# Altium footprint library SBCLib.PcbLib: 120 footprints (part 3 of 8)
Each footprint in its own frame and in the unit in brackets; x right, y up, seen from the top. Pads: shape width x height; smd on the part's side, far side on the other; paste and mask are expansions set on the pad; w line width, h text height; cw(c..) or ccw(c..) is an arc to the next point about the centre after c.
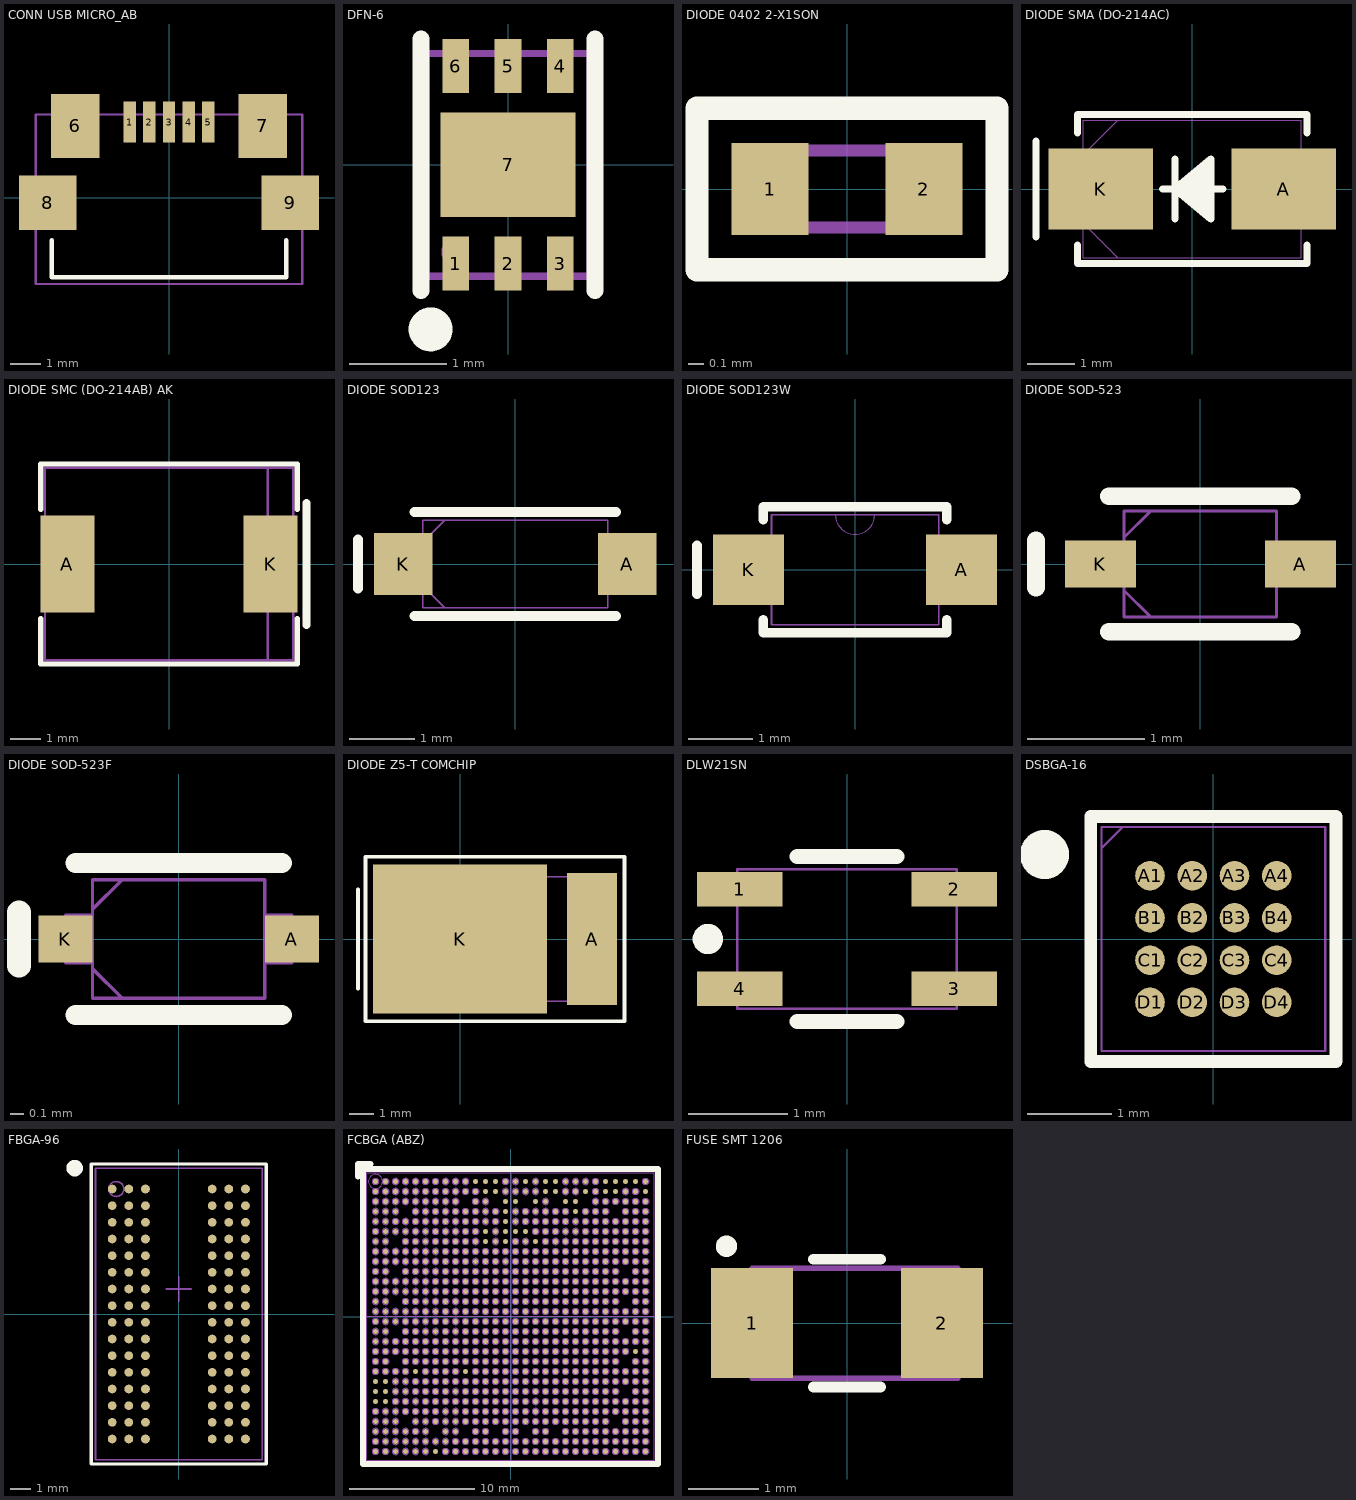
[diagram p2: the footprints below, top view; thin cyan lines are the x and y axes]

## CONN USB MICRO_AB [mil]
pads (9):
  rect 16x53 smd paste+0: 1(-51.18,98.5) 2(-25.59,98.5) 3(0,98.5) 4(25.59,98.5) 5(51.18,98.5)
  rect 63x83 smd: 6(-122,93.5) 7(122,93.5)
  rect 75x71 smd: 8(-157.5,-6.5) 9(157.5,-6.5)
Top Overlay:
  lines w6: -152.5,-55.1 -152.5,-103.5 152.5,-103.5 152.5,-55.1
Mechanical 3:
  lines w3: -173.23,-112.14 173.23,-112.14 173.23,108.34 -173.23,108.34 -173.23,-112.14
3D body "ZX62-AB-5PA.stp": height 108.27, standoff -7.87, extent -173.23,-112.14 173.23,108.34

## DFN-6 [mm] "SKY65723"
pads (7):
  rect 0.275x0.56 smd paste+0: 1(-0.54,-1.02) 2(0,-1.02) 3(0.54,-1.02) 4(0.54,1.02) 5(0,1.02) 6(-0.54,1.02)
  rect 1.4x1.08 smd paste+0: 7(0,0)
Top Overlay:
  circle w0.254: c-0.8,-1.7 r0.1
  lines w0.178: -0.9,-1.3 -0.9,1.3 ; 0.9,-1.3 0.9,1.3
Mechanical 3:
  circle w0.076: c-0.55,-0.9 r0.1
  lines w0.076: -0.85,-1.15 -0.85,1.15 0.85,1.15 0.85,-1.15 -0.85,-1.15
3D body: height 0.7, standoff 0, extent -0.85,-1.15 0.85,1.15

## DIODE 0402 2-X1SON [mm]
pads (2):
  rect 0.5x0.6 smd mask+0.05: 1(-0.5,0) 2(0.5,0)
Top Overlay:
  lines w0.152: -0.976,-0.526 -0.976,0.526 0.976,0.526 0.976,-0.526 -0.976,-0.526
Mechanical 3:
  lines w0.076: -0.55,-0.25 -0.55,0.25 0.55,0.25 0.55,-0.25 -0.55,-0.25
3D body "DPY0002A.stp": height 0.45, standoff 0, extent -0.5,-0.3 0.5,0.3

## DIODE SMA (DO-214AC) [mil] "GENERIC SMA DIODE"
height 90
pads (2):
  rect 87x67 smd paste+0: A(76,0) K(-76,0)
Top Overlay:
  lines w6: -130,-40 -130,40 ; -95.5,-46.6 -95.5,-62 95.5,-62 95.5,-46.6 ; -95.5,46.6 -95.5,62 95.5,62 95.5,46.6 ; -24.5,0 25.5,0 ; -14.5,-25 -14.5,25 ; 15.5,-20 -14.5,0 ; 15.5,-15 -14.5,0 ; 15.5,-10 -14.5,0 ; 15.5,-5 -14.5,0 ; 15.5,5 -14.5,0 ; 15.5,10 -14.5,0 ; 15.5,15 -14.5,0 ; 15.5,20 -14.5,0 ; -14.5,0 15.5,-25 15.5,25 -14.5,0
Mechanical 3:
  lines w1: -90.5,-28.5 -62,-57 ; -90.5,28.5 -62,57 ; -105.5,-32.5 -105.5,32.5 -90.5,32.5 -90.5,-32.5 -105.5,-32.5 ; -90.5,-57 90.5,-57 90.5,57 -90.5,57 -90.5,-57 ; 90.5,-32.5 90.5,32.5 105.5,32.5 105.5,-32.5 90.5,-32.5
3D body "SMA_STM.step": height 123.78, standoff 0.18, extent -105.5,-57 105.52,57.01

## DIODE SMC (DO-214AB) AK [mm]
pads (2):
  rect 1.778x3.175 smd: A(-3.325,0) K(3.325,0)
Top Overlay:
  lines w0.178: -4.2,-1.8 -4.2,-3.275 4.2,-3.275 4.2,-1.8 ; -4.2,1.8 -4.2,3.275 4.2,3.275 4.2,1.8
  lines w0.254: 4.5,-2 4.5,2
Mechanical 3:
  lines w0.076: 3.232,-3.15 3.232,3.15 ; -4.064,-3.15 -4.064,3.15 4.064,3.15 4.064,-3.15 -4.064,-3.15
3D body "DO-214AB(SMC).step": height 2.67, standoff 0.03, extent -4.064,-3.15 4.064,3.15

## DIODE SOD123 [mm]
pads (2):
  rect 0.9x0.95 smd: A(1.725,0) K(-1.725,0)
Top Overlay:
  lines w0.152: -2.425,-0.375 -2.425,0.375 ; -1.552,-0.802 1.552,-0.802 ; -1.552,0.802 1.552,0.802
Mechanical 3:
  lines w0.025: -1.425,-0.337 -1.087,-0.675 ; -1.425,0.337 -1.087,0.675 ; -1.925,-0.275 -1.425,-0.275 -1.425,0.275 -1.925,0.275 -1.925,-0.275 ; -1.425,-0.675 -1.425,0.675 1.425,0.675 1.425,-0.675 -1.425,-0.675 ; 1.425,-0.275 1.925,-0.275 1.925,0.275 1.425,0.275 1.425,-0.275
3D body "SOD123_DIO.step": height 0.81, standoff 0, extent -1.925,-0.675 1.925,0.675

## DIODE SOD123W [mm]
pads (2):
  rect 1.1x1.1 smd: A(1.651,0) K(-1.651,0)
Top Overlay:
  lines w0.152: -2.451,-0.375 -2.451,0.375 ; -1.423,-0.777 -1.423,-0.978 1.422,-0.978 ; -1.422,0.777 -1.422,0.978 1.422,0.978 1.422,0.777 ; 1.422,-0.978 1.422,-0.777 1.422,-0.978
Mechanical 3:
  circle w0: c-1.245,0 r0.076
  lines w0: -0.305,0.851 ccw(c0,0.851) 0.305,0.851
  lines w0.025: -1.295,-0.851 1.295,-0.851 1.295,0.851 -1.295,0.851 -1.295,-0.851
3D body "User Library-SOD123W.step": height 1.1, standoff -0.01, extent -2,-0.95 2,0.95

## DIODE SOD-523 [mm]
pads (2):
  rect 0.605x0.401 smd paste+0 mask+0: A(0.852,0) K(-0.852,0)
Top Overlay:
  lines w0.152: -1.4,-0.2 -1.4,0.2 ; -0.777,-0.577 0.777,-0.577 ; -0.777,0.577 0.777,0.577
Mechanical 3:
  lines w0.025: -0.65,-0.225 -0.425,-0.45 ; -0.65,0.225 -0.425,0.45 ; -0.85,-0.175 -0.85,0.175 -0.65,0.175 -0.65,-0.175 -0.85,-0.175 ; -0.65,-0.45 0.65,-0.45 0.65,0.45 -0.65,0.45 -0.65,-0.45 ; 0.65,-0.175 0.65,0.175 0.85,0.175 0.85,-0.175 0.65,-0.175
3D body "SOD523_DIO.step": height 0.82, standoff 0, extent -0.85,-0.45 0.85,0.45

## DIODE SOD-523F [mil]
pads (2):
  rect 16x14 smd paste+0 mask+0: A(33.5,0) K(-33.5,0)
Top Overlay:
  lines w6: -30.5,-22.5 30.5,-22.5 ; -30.5,22.5 30.5,22.5
  lines w7: -47.24,-7.87 -47.24,7.87
Mechanical 3:
  lines w1: -25.5,-8.75 -16.75,-17.5 ; -25.5,8.75 -16.75,17.5 ; -33.5,-7 -25.5,-7 -25.5,7 -33.5,7 -33.5,-7 ; -25.5,-17.5 -25.5,17.5 25.5,17.5 25.5,-17.5 -25.5,-17.5 ; 25.5,-7 33.5,-7 33.5,7 25.5,7 25.5,-7
3D body "CR_SOD-523F_ONS.step": height 28.27, standoff 0, extent -33.51,-17.48 33.5,17.48

## DIODE Z5-T COMCHIP [mm]
pads (2):
  rect 2x5.3 smd: A(5.3,0)
  rect 7x6 smd: K(0,0)
Top Overlay:
  lines w0.152: -4.1,-2 -4.1,2 ; -3.8,-3.3 -3.8,3.3 6.6,3.3 6.6,-3.3 -1,-3.3 -3.8,-3.3
Mechanical 3:
  lines w0.076: -2.6,-2.5 5.4,-2.5 5.4,2.5 -2.6,2.5 -2.6,-2.5
Mechanical 4:
  lines w0.076: -2.6,-2.5 -2.6,2.5 5.4,2.5 5.4,-2.5 -2.6,-2.5
3D body: height 1.35, standoff 0, extent -2.6,-2.5 5.4,2.5

## DLW21SN [mm]
pads (4):
  rect 0.856x0.349 smd paste+0 mask+0: 1(-1.078,0.5) 2(1.078,0.5) 3(1.078,-0.5) 4(-1.078,-0.5)
Top Overlay:
  circle w0.152: c-1.397,0 r0.076
  lines w0.152: -0.5,-0.827 0.5,-0.827 ; -0.5,0.827 0.5,0.827
Mechanical 3:
  lines w0.025: -1.1,-0.7 1.1,-0.7 1.1,0.7 -1.1,0.7 -1.1,-0.7
3D body "IND_DLW21S_0805_MUR.step": height 1.4, standoff 0, extent -1.1,-0.7 1.1,0.7

## DSBGA-16 [mm]
pads (16):
  round 0.35 smd: A1(-0.75,0.75) A2(-0.25,0.75) A3(0.25,0.75) A4(0.75,0.75) B1(-0.75,0.25) B2(-0.25,0.25) B3(0.25,0.25) B4(0.75,0.25) C1(-0.75,-0.25) C2(-0.25,-0.25) C3(0.25,-0.25) C4(0.75,-0.25) D1(-0.75,-0.75) D2(-0.25,-0.75) D3(0.25,-0.75) D4(0.75,-0.75)
Top Overlay:
  circle w0.381: c-2,1 r0.1
  lines w0.152: -1.452,-1.452 -1.452,1.452 1.452,1.452 1.452,-1.452 -1.452,-1.452
Mechanical 3:
  lines w0.025: -1.325,1.075 -1.075,1.325 ; -1.325,-1.325 -1.325,1.325 1.325,1.325 1.325,-1.325 -1.325,-1.325
3D body "YZH16.step": height 0.63, standoff 0, extent -1.325,-1.325 1.325,1.325

## FBGA-96 [mm]
pads (96):
  round 0.42 smd paste+0: A1(-3.2,6)
  round 0.42 smd: A2(-2.4,6) A3(-1.6,6) A7(1.6,6) A8(2.4,6) A9(3.2,6) B1(-3.2,5.2) B2(-2.4,5.2) B3(-1.6,5.2) B7(1.6,5.2) B8(2.4,5.2) B9(3.2,5.2) C1(-3.2,4.4) C2(-2.4,4.4) C3(-1.6,4.4) C7(1.6,4.4) C8(2.4,4.4) C9(3.2,4.4) D1(-3.2,3.6) D2(-2.4,3.6) D3(-1.6,3.6) D7(1.6,3.6) D8(2.4,3.6) D9(3.2,3.6) E1(-3.2,2.8) E2(-2.4,2.8) E3(-1.6,2.8) E7(1.6,2.8) E8(2.4,2.8) E9(3.2,2.8) F1(-3.2,2) F2(-2.4,2) F3(-1.6,2) F7(1.6,2) F8(2.4,2) F9(3.2,2) G1(-3.2,1.2) G2(-2.4,1.2) G3(-1.6,1.2) G7(1.6,1.2) G8(2.4,1.2) G9(3.2,1.2) H1(-3.2,0.4) H2(-2.4,0.4) H3(-1.6,0.4) H7(1.6,0.4) H8(2.4,0.4) H9(3.2,0.4) J1(-3.2,-0.4) J2(-2.4,-0.4) J3(-1.6,-0.4) J7(1.6,-0.4) J8(2.4,-0.4) J9(3.2,-0.4) K1(-3.2,-1.2) K2(-2.4,-1.2) K3(-1.6,-1.2) K7(1.6,-1.2) K8(2.4,-1.2) K9(3.2,-1.2) L1(-3.2,-2) L2(-2.4,-2) L3(-1.6,-2) L7(1.6,-2) L8(2.4,-2) L9(3.2,-2) M1(-3.2,-2.8) M2(-2.4,-2.8) M3(-1.6,-2.8) M7(1.6,-2.8) M8(2.4,-2.8) M9(3.2,-2.8) N1(-3.2,-3.6) N2(-2.4,-3.6) N3(-1.6,-3.6) N7(1.6,-3.6) N8(2.4,-3.6) N9(3.2,-3.6) P1(-3.2,-4.4) P2(-2.4,-4.4) P3(-1.6,-4.4) P7(1.6,-4.4) P8(2.4,-4.4) P9(3.2,-4.4) R1(-3.2,-5.2) R2(-2.4,-5.2) R3(-1.6,-5.2) R7(1.6,-5.2) R8(2.4,-5.2) R9(3.2,-5.2) T1(-3.2,-6) T2(-2.4,-6) T3(-1.6,-6) T7(1.6,-6) T8(2.4,-6) T9(3.2,-6)
Top Overlay:
  circle w0.5: c-5,7 r0.141
  lines w0.152: -4.2,-7.2 4.2,-7.2 4.2,7.2 -4.2,7.2 -4.2,-7.2
Mechanical 3:
  circle w0.076: c-3,6 r0.361
  lines w0.076: -0.6,1.2 0,1.2 ; 0,0.6 0,1.2 ; 0,1.8 0,1.2 ; 0.6,1.2 0,1.2 ; -4,-7 -4,7 4,7 4,-7 -4,-7
3D body: height 1.11, standoff 0.3, extent -3.496,5.501 -2.5,6.499
3D body: height 0.44, standoff 0, extent -3.42,-3.783 -2.98,-3.35
3D body: height 0.44, standoff 0, extent -2.62,-3.783 -2.18,-3.35
3D body: height 0.44, standoff 0, extent -1.82,-3.783 -1.38,-3.35
3D body: height 0.44, standoff 0, extent 2.98,-3.783 3.42,-3.35
3D body: height 0.44, standoff 0, extent 2.18,-3.783 2.62,-3.35
3D body: height 0.44, standoff 0, extent 1.38,-3.783 1.82,-3.35
3D body: height 0.44, standoff 0, extent -3.42,-2.183 -2.98,-1.75
3D body: height 0.44, standoff 0, extent -2.62,-2.183 -2.18,-1.75
3D body: height 0.44, standoff 0, extent -1.82,-2.183 -1.38,-1.75
3D body: height 0.44, standoff 0, extent 2.98,-2.183 3.42,-1.75
3D body: height 0.44, standoff 0, extent 2.18,-2.183 2.62,-1.75
3D body: height 0.44, standoff 0, extent 1.38,-2.183 1.82,-1.75
3D body: height 0.44, standoff 0, extent 1.38,-2.983 1.82,-2.55
3D body: height 0.44, standoff 0, extent 2.18,-2.983 2.62,-2.55
3D body: height 0.44, standoff 0, extent 2.98,-2.983 3.42,-2.55
3D body: height 0.44, standoff 0, extent -1.82,-2.983 -1.38,-2.55
3D body: height 0.44, standoff 0, extent -2.62,-2.983 -2.18,-2.55
3D body: height 0.44, standoff 0, extent -3.42,-2.983 -2.98,-2.55
3D body: height 0.44, standoff 0, extent -3.42,-0.583 -2.98,-0.15
3D body: height 0.44, standoff 0, extent -2.62,-0.583 -2.18,-0.15
3D body: height 0.44, standoff 0, extent -1.82,-0.583 -1.38,-0.15
3D body: height 0.44, standoff 0, extent 2.98,-0.583 3.42,-0.15
3D body: height 0.44, standoff 0, extent 2.18,-0.583 2.62,-0.15
3D body: height 0.44, standoff 0, extent 1.38,-0.583 1.82,-0.15
3D body: height 0.44, standoff 0, extent 1.38,-1.383 1.82,-0.95
3D body: height 0.44, standoff 0, extent 2.18,-1.383 2.62,-0.95
3D body: height 0.44, standoff 0, extent 2.98,-1.383 3.42,-0.95
3D body: height 0.44, standoff 0, extent -1.82,-1.383 -1.38,-0.95
3D body: height 0.44, standoff 0, extent -2.62,-1.383 -2.18,-0.95
3D body: height 0.44, standoff 0, extent -3.42,-1.383 -2.98,-0.95
3D body: height 0.44, standoff 0, extent -3.42,1.017 -2.98,1.45
3D body: height 0.44, standoff 0, extent -2.62,1.017 -2.18,1.45
3D body: height 0.44, standoff 0, extent -1.82,1.017 -1.38,1.45
3D body: height 0.44, standoff 0, extent 2.98,1.017 3.42,1.45
3D body: height 0.44, standoff 0, extent 2.18,1.017 2.62,1.45
3D body: height 0.44, standoff 0, extent 1.38,1.017 1.82,1.45
3D body: height 0.44, standoff 0, extent 1.38,0.217 1.82,0.65
3D body: height 0.44, standoff 0, extent 2.18,0.217 2.62,0.65
3D body: height 0.44, standoff 0, extent 2.98,0.217 3.42,0.65
3D body: height 0.44, standoff 0, extent -1.82,0.217 -1.38,0.65
3D body: height 0.44, standoff 0, extent -2.62,0.217 -2.18,0.65
3D body: height 0.44, standoff 0, extent -3.42,0.217 -2.98,0.65
3D body: height 0.44, standoff 0, extent -3.42,2.617 -2.98,3.05
3D body: height 0.44, standoff 0, extent -2.62,2.617 -2.18,3.05
3D body: height 0.44, standoff 0, extent -1.82,2.617 -1.38,3.05
3D body: height 0.44, standoff 0, extent 2.98,2.617 3.42,3.05
3D body: height 0.44, standoff 0, extent 2.18,2.617 2.62,3.05
3D body: height 0.44, standoff 0, extent 1.38,2.617 1.82,3.05
3D body: height 0.44, standoff 0, extent 1.38,1.817 1.82,2.25
3D body: height 0.44, standoff 0, extent 2.18,1.817 2.62,2.25
3D body: height 0.44, standoff 0, extent 2.98,1.817 3.42,2.25
3D body: height 0.44, standoff 0, extent -1.82,1.817 -1.38,2.25
3D body: height 0.44, standoff 0, extent -2.62,1.817 -2.18,2.25
3D body: height 0.44, standoff 0, extent -3.42,1.817 -2.98,2.25
3D body: height 0.44, standoff 0, extent -3.42,4.217 -2.98,4.65
3D body: height 0.44, standoff 0, extent -2.62,4.217 -2.18,4.65
3D body: height 0.44, standoff 0, extent -1.82,4.217 -1.38,4.65
3D body: height 0.44, standoff 0, extent 2.98,4.217 3.42,4.65
3D body: height 0.44, standoff 0, extent 2.18,4.217 2.62,4.65
3D body: height 0.44, standoff 0, extent 1.38,4.217 1.82,4.65
3D body: height 0.44, standoff 0, extent 1.38,3.417 1.82,3.85
3D body: height 0.44, standoff 0, extent 2.18,3.417 2.62,3.85
3D body: height 0.44, standoff 0, extent 2.98,3.417 3.42,3.85
3D body: height 0.44, standoff 0, extent -1.82,3.417 -1.38,3.85
3D body: height 0.44, standoff 0, extent -2.62,3.417 -2.18,3.85
3D body: height 0.44, standoff 0, extent -3.42,3.417 -2.98,3.85
3D body: height 0.44, standoff 0, extent -3.42,5.017 -2.98,5.45
3D body: height 0.44, standoff 0, extent -2.62,5.017 -2.18,5.45
3D body: height 0.44, standoff 0, extent -1.82,5.017 -1.38,5.45
3D body: height 0.44, standoff 0, extent 2.98,5.017 3.42,5.45
3D body: height 0.44, standoff 0, extent 2.18,5.017 2.62,5.45
3D body: height 0.44, standoff 0, extent 1.38,5.017 1.82,5.45
3D body: height 0.44, standoff 0, extent 1.38,5.817 1.82,6.25
3D body: height 0.44, standoff 0, extent 2.18,5.817 2.62,6.25
3D body: height 0.44, standoff 0, extent 2.98,5.817 3.42,6.25
3D body: height 0.44, standoff 0, extent -1.82,5.817 -1.38,6.25
3D body: height 0.44, standoff 0, extent -2.62,5.817 -2.18,6.25
3D body: height 0.44, standoff 0, extent -3.42,5.817 -2.98,6.25
3D body: height 1.1, standoff 0.29, extent -4,-7 4,7
3D body: height 0.44, standoff 0, extent -3.42,-5.383 -2.98,-4.95
3D body: height 0.44, standoff 0, extent -2.62,-5.383 -2.18,-4.95
3D body: height 0.44, standoff 0, extent -1.82,-5.383 -1.38,-4.95
3D body: height 0.44, standoff 0, extent 2.98,-5.383 3.42,-4.95
3D body: height 0.44, standoff 0, extent 2.18,-5.383 2.62,-4.95
3D body: height 0.44, standoff 0, extent 1.38,-5.383 1.82,-4.95
3D body: height 0.44, standoff 0, extent 1.38,-4.583 1.82,-4.15
3D body: height 0.44, standoff 0, extent 2.18,-4.583 2.62,-4.15
3D body: height 0.44, standoff 0, extent 2.98,-4.583 3.42,-4.15
3D body: height 0.44, standoff 0, extent -1.82,-4.583 -1.38,-4.15
3D body: height 0.44, standoff 0, extent -2.62,-4.583 -2.18,-4.15
3D body: height 0.44, standoff 0, extent -3.42,-4.583 -2.98,-4.15
3D body: height 0.44, standoff 0, extent 1.38,-6.183 1.82,-5.75
3D body: height 0.44, standoff 0, extent 2.18,-6.183 2.62,-5.75
3D body: height 0.44, standoff 0, extent 2.98,-6.183 3.42,-5.75
3D body: height 0.44, standoff 0, extent -1.82,-6.183 -1.38,-5.75
3D body: height 0.44, standoff 0, extent -2.62,-6.183 -2.18,-5.75
3D body: height 0.44, standoff 0, extent -3.42,-6.183 -2.98,-5.75

## FCBGA (ABZ) [mm]
pads (760):
  round 0.4 smd paste+0 mask+0.04: A1(-10.8,10.8) A2(-10,10.8) A3(-9.2,10.8) A4(-8.4,10.8) A5(-7.6,10.8) A6(-6.8,10.8) A7(-6,10.8) A8(-5.2,10.8) A9(-4.4,10.8) A10(-3.6,10.8) A11(-2.8,10.8) A12(-2,10.8) A13(-1.2,10.8) A14(-0.4,10.8) A15(0.4,10.8) A16(1.2,10.8) A17(2,10.8) A18(2.8,10.8) A19(3.6,10.8) A20(4.4,10.8) A21(5.2,10.8) A22(6,10.8) A23(6.8,10.8) A24(7.6,10.8) A25(8.4,10.8) A26(9.2,10.8) A27(10,10.8) A28(10.8,10.8)
  round 0.4 smd mask+0.05: AA1(-10.8,-5.2) AA2(-10,-5.2) AA3(-9.2,-5.2) AA4(-8.4,-5.2) AA5(-7.6,-5.2) AA6(-6.8,-5.2) AA7(-6,-5.2) AA8(-5.2,-5.2) AA9(-4.4,-5.2) AA10(-3.6,-5.2) AA11(-2.8,-5.2) AA12(-2,-5.2) AA13(-1.2,-5.2) AA14(-0.4,-5.2) AA15(0.4,-5.2) AA16(1.2,-5.2) AA17(2,-5.2) AA18(2.8,-5.2) AA19(3.6,-5.2) AA20(4.4,-5.2) AA21(5.2,-5.2) AA22(6,-5.2) AA23(6.8,-5.2) AA24(7.6,-5.2) AA25(8.4,-5.2) AA26(9.2,-5.2) AA27(10,-5.2) AA28(10.8,-5.2) AB1(-10.8,-6) AB2(-10,-6) AB3(-9.2,-6) AB4(-8.4,-6) AB5(-7.6,-6) AB6(-6.8,-6) AB7(-6,-6) AB8(-5.2,-6) AB9(-4.4,-6) AB10(-3.6,-6) AB11(-2.8,-6) AB12(-2,-6) AB13(-1.2,-6) AB14(-0.4,-6) AB15(0.4,-6) AB16(1.2,-6) AB17(2,-6) AB18(2.8,-6) AB19(3.6,-6) AB20(4.4,-6) AB21(5.2,-6) AB22(6,-6) AB23(6.8,-6) AB24(7.6,-6) AB25(8.4,-6) AB27(10,-6) AB28(10.8,-6) AC1(-10.8,-6.8) AC2(-10,-6.8) AC3(-9.2,-6.8) AC4(-8.4,-6.8) AC5(-7.6,-6.8) AC6(-6.8,-6.8) AC7(-6,-6.8) AC8(-5.2,-6.8) AC9(-4.4,-6.8) AC10(-3.6,-6.8) AC11(-2.8,-6.8) AC12(-2,-6.8) AC13(-1.2,-6.8) AC14(-0.4,-6.8) AC15(0.4,-6.8) AC16(1.2,-6.8) AC17(2,-6.8) AC18(2.8,-6.8) AC19(3.6,-6.8) AC20(4.4,-6.8) AC21(5.2,-6.8) AC22(6,-6.8) AC23(6.8,-6.8) AC24(7.6,-6.8) AC25(8.4,-6.8) AC26(9.2,-6.8) AC27(10,-6.8) AC28(10.8,-6.8) AD1(-10.8,-7.6) AD2(-10,-7.6) AD3(-9.2,-7.6) AD4(-8.4,-7.6) AD5(-7.6,-7.6) AD6(-6.8,-7.6) AD7(-6,-7.6) AD8(-5.2,-7.6) AD9(-4.4,-7.6) AD10(-3.6,-7.6) AD11(-2.8,-7.6) AD12(-2,-7.6) AD13(-1.2,-7.6) AD14(-0.4,-7.6) AD15(0.4,-7.6) AD16(1.2,-7.6) AD17(2,-7.6) AD18(2.8,-7.6) AD19(3.6,-7.6) AD20(4.4,-7.6) AD21(5.2,-7.6) AD22(6,-7.6) AD23(6.8,-7.6) AD24(7.6,-7.6) AD25(8.4,-7.6) AD26(9.2,-7.6) AD27(10,-7.6) AD28(10.8,-7.6) AE1(-10.8,-8.4) AE2(-10,-8.4) AE3(-9.2,-8.4) AE5(-7.6,-8.4) AE6(-6.8,-8.4) AE7(-6,-8.4) AE8(-5.2,-8.4) AE9(-4.4,-8.4) AE10(-3.6,-8.4) AE11(-2.8,-8.4) AE12(-2,-8.4) AE13(-1.2,-8.4) AE14(-0.4,-8.4) AE15(0.4,-8.4) AE16(1.2,-8.4) AE17(2,-8.4) AE18(2.8,-8.4) AE19(3.6,-8.4) AE20(4.4,-8.4) AE21(5.2,-8.4) AE22(6,-8.4) AE23(6.8,-8.4) AE24(7.6,-8.4) AE26(9.2,-8.4) AE27(10,-8.4) AE28(10.8,-8.4) AF1(-10.8,-9.2) AF2(-10,-9.2) AF3(-9.2,-9.2) AF4(-8.4,-9.2) AF5(-7.6,-9.2) AF6(-6.8,-9.2) AF8(-5.2,-9.2) AF9(-4.4,-9.2) AF11(-2.8,-9.2) AF12(-2,-9.2) AF14(-0.4,-9.2) AF15(0.4,-9.2) AF17(2,-9.2) AF18(2.8,-9.2) AF20(4.4,-9.2) AF21(5.2,-9.2) AF22(6,-9.2) AF23(6.8,-9.2) AF24(7.6,-9.2) AF25(8.4,-9.2) AF26(9.2,-9.2) AF27(10,-9.2) AF28(10.8,-9.2) AG1(-10.8,-10) AG2(-10,-10) AG3(-9.2,-10) AG4(-8.4,-10) AG5(-7.6,-10) AG6(-6.8,-10) AG7(-6,-10) AG8(-5.2,-10) AG9(-4.4,-10) AG10(-3.6,-10) AG11(-2.8,-10) AG12(-2,-10) AG13(-1.2,-10) AG14(-0.4,-10) AG15(0.4,-10) AG16(1.2,-10) AG17(2,-10) AG18(2.8,-10) AG19(3.6,-10) AG20(4.4,-10) AG21(5.2,-10) AG22(6,-10) AG23(6.8,-10) AG24(7.6,-10) AG25(8.4,-10) AG26(9.2,-10) AG27(10,-10) AG28(10.8,-10) AH1(-10.8,-10.8) AH2(-10,-10.8) AH3(-9.2,-10.8) AH4(-8.4,-10.8) AH5(-7.6,-10.8) AH6(-6.8,-10.8) AH7(-6,-10.8) AH8(-5.2,-10.8) AH9(-4.4,-10.8) AH10(-3.6,-10.8) AH11(-2.8,-10.8) AH12(-2,-10.8) AH13(-1.2,-10.8) AH14(-0.4,-10.8) AH15(0.4,-10.8) AH16(1.2,-10.8) AH17(2,-10.8) AH18(2.8,-10.8) AH19(3.6,-10.8) AH20(4.4,-10.8) AH21(5.2,-10.8) AH22(6,-10.8) AH23(6.8,-10.8) AH24(7.6,-10.8) AH25(8.4,-10.8) AH26(9.2,-10.8) AH27(10,-10.8) AH28(10.8,-10.8) B1(-10.8,10) B2(-10,10) B3(-9.2,10) B4(-8.4,10) B5(-7.6,10) B6(-6.8,10) B7(-6,10) B8(-5.2,10) B9(-4.4,10) B10(-3.6,10) B11(-2.8,10) B12(-2,10) B13(-1.2,10) B14(-0.4,10) B15(0.4,10) B16(1.2,10) B17(2,10) B18(2.8,10) B19(3.6,10) B20(4.4,10) B21(5.2,10) B22(6,10) B23(6.8,10) B24(7.6,10) B25(8.4,10) B26(9.2,10) B27(10,10) B28(10.8,10) C1(-10.8,9.2) C2(-10,9.2) C3(-9.2,9.2) C4(-8.4,9.2) C5(-7.6,9.2) C6(-6.8,9.2) C7(-6,9.2) C8(-5.2,9.2) C9(-4.4,9.2) C11(-2.8,9.2) C12(-2,9.2) C14(-0.4,9.2) C15(0.4,9.2) C17(2,9.2) C18(2.8,9.2) C20(4.4,9.2) C21(5.2,9.2) C23(6.8,9.2) C24(7.6,9.2) C25(8.4,9.2) C26(9.2,9.2) C27(10,9.2) C28(10.8,9.2) D1(-10.8,8.4) D2(-10,8.4) D3(-9.2,8.4) D5(-7.6,8.4) D6(-6.8,8.4) D7(-6,8.4) D8(-5.2,8.4) D9(-4.4,8.4) D10(-3.6,8.4) D11(-2.8,8.4) D12(-2,8.4) D13(-1.2,8.4) D14(-0.4,8.4) D15(0.4,8.4) D16(1.2,8.4) D17(2,8.4) D18(2.8,8.4) D19(3.6,8.4) D20(4.4,8.4) D21(5.2,8.4) D22(6,8.4) D23(6.8,8.4) D24(7.6,8.4) D26(9.2,8.4) D27(10,8.4) D28(10.8,8.4) E1(-10.8,7.6) E2(-10,7.6) E3(-9.2,7.6) E4(-8.4,7.6) E5(-7.6,7.6) E6(-6.8,7.6) E7(-6,7.6) E8(-5.2,7.6) E9(-4.4,7.6) E10(-3.6,7.6) E11(-2.8,7.6) E12(-2,7.6) E13(-1.2,7.6) E14(-0.4,7.6) E15(0.4,7.6) E16(1.2,7.6) E17(2,7.6) E18(2.8,7.6) E19(3.6,7.6) E20(4.4,7.6) E21(5.2,7.6) E22(6,7.6) E23(6.8,7.6) E24(7.6,7.6) E25(8.4,7.6) E26(9.2,7.6) E27(10,7.6) E28(10.8,7.6) F1(-10.8,6.8) F2(-10,6.8) F3(-9.2,6.8) F4(-8.4,6.8) F5(-7.6,6.8) F6(-6.8,6.8) F7(-6,6.8) F8(-5.2,6.8) F9(-4.4,6.8) F10(-3.6,6.8) F11(-2.8,6.8) F12(-2,6.8) F13(-1.2,6.8) F14(-0.4,6.8) F15(0.4,6.8) F16(1.2,6.8) F17(2,6.8) F18(2.8,6.8) F19(3.6,6.8) F20(4.4,6.8) F21(5.2,6.8) F22(6,6.8) F23(6.8,6.8) F24(7.6,6.8) F25(8.4,6.8) F26(9.2,6.8) F27(10,6.8) F28(10.8,6.8) G1(-10.8,6) G2(-10,6) G4(-8.4,6) G5(-7.6,6) G6(-6.8,6) G7(-6,6) G8(-5.2,6) G9(-4.4,6) G10(-3.6,6) G11(-2.8,6) G12(-2,6) G13(-1.2,6) G14(-0.4,6) G15(0.4,6) G16(1.2,6) G17(2,6) G18(2.8,6) G19(3.6,6) G20(4.4,6) G21(5.2,6) G22(6,6) G23(6.8,6) G24(7.6,6) G25(8.4,6) G26(9.2,6) G27(10,6) G28(10.8,6) H1(-10.8,5.2) H2(-10,5.2) H3(-9.2,5.2) H4(-8.4,5.2) H5(-7.6,5.2) H6(-6.8,5.2) H7(-6,5.2) H8(-5.2,5.2) H9(-4.4,5.2) H10(-3.6,5.2) H11(-2.8,5.2) H12(-2,5.2) H13(-1.2,5.2) H14(-0.4,5.2) H15(0.4,5.2) H16(1.2,5.2) H17(2,5.2) H18(2.8,5.2) H19(3.6,5.2) H20(4.4,5.2) H21(5.2,5.2) H22(6,5.2) H23(6.8,5.2) H24(7.6,5.2) H25(8.4,5.2) H26(9.2,5.2) H27(10,5.2) H28(10.8,5.2) J1(-10.8,4.4) J2(-10,4.4) J3(-9.2,4.4) J4(-8.4,4.4) J5(-7.6,4.4) J6(-6.8,4.4) J7(-6,4.4) J8(-5.2,4.4) J9(-4.4,4.4) J10(-3.6,4.4) J11(-2.8,4.4) J12(-2,4.4) J13(-1.2,4.4) J14(-0.4,4.4) J15(0.4,4.4) J16(1.2,4.4) J17(2,4.4) J18(2.8,4.4) J19(3.6,4.4) J20(4.4,4.4) J21(5.2,4.4) J22(6,4.4) J23(6.8,4.4) J24(7.6,4.4) J25(8.4,4.4) J26(9.2,4.4) J27(10,4.4) J28(10.8,4.4) K1(-10.8,3.6) K2(-10,3.6) K4(-8.4,3.6) K5(-7.6,3.6) K6(-6.8,3.6) K7(-6,3.6) K8(-5.2,3.6) K9(-4.4,3.6) K10(-3.6,3.6) K11(-2.8,3.6) K12(-2,3.6) K13(-1.2,3.6) K14(-0.4,3.6) K15(0.4,3.6) K16(1.2,3.6) K17(2,3.6) K18(2.8,3.6) K19(3.6,3.6) K20(4.4,3.6) K21(5.2,3.6) K22(6,3.6) K23(6.8,3.6) K24(7.6,3.6) K25(8.4,3.6) K27(10,3.6) K28(10.8,3.6) L1(-10.8,2.8) L2(-10,2.8) L3(-9.2,2.8) L4(-8.4,2.8) L5(-7.6,2.8) L6(-6.8,2.8) L7(-6,2.8) L8(-5.2,2.8) L9(-4.4,2.8) L10(-3.6,2.8) L11(-2.8,2.8) L12(-2,2.8) L13(-1.2,2.8) L14(-0.4,2.8) L15(0.4,2.8) L16(1.2,2.8) L17(2,2.8) L18(2.8,2.8) L19(3.6,2.8) L20(4.4,2.8) L21(5.2,2.8) L22(6,2.8) L23(6.8,2.8) L24(7.6,2.8) L25(8.4,2.8) L26(9.2,2.8) L27(10,2.8) L28(10.8,2.8) M1(-10.8,2) M2(-10,2) M3(-9.2,2) M4(-8.4,2) M5(-7.6,2) M6(-6.8,2) M7(-6,2) M8(-5.2,2) M9(-4.4,2) M10(-3.6,2) M11(-2.8,2) M12(-2,2) M13(-1.2,2) M14(-0.4,2) M15(0.4,2) M16(1.2,2) M17(2,2) M18(2.8,2) M19(3.6,2) M20(4.4,2) M21(5.2,2) M22(6,2) M23(6.8,2) M24(7.6,2) M25(8.4,2) M26(9.2,2) M27(10,2) M28(10.8,2) N1(-10.8,1.2) N2(-10,1.2) N4(-8.4,1.2) N5(-7.6,1.2) N6(-6.8,1.2) N7(-6,1.2) N8(-5.2,1.2) N9(-4.4,1.2) N10(-3.6,1.2) N11(-2.8,1.2) N12(-2,1.2) N13(-1.2,1.2) N14(-0.4,1.2) N15(0.4,1.2) N16(1.2,1.2) N17(2,1.2) N18(2.8,1.2) N19(3.6,1.2) N20(4.4,1.2) N21(5.2,1.2) N22(6,1.2) N23(6.8,1.2) N24(7.6,1.2) N25(8.4,1.2) N27(10,1.2) N28(10.8,1.2) P1(-10.8,0.4) P2(-10,0.4) P3(-9.2,0.4) P4(-8.4,0.4) P5(-7.6,0.4) P6(-6.8,0.4) P7(-6,0.4) P8(-5.2,0.4) P9(-4.4,0.4) P10(-3.6,0.4) P11(-2.8,0.4) P12(-2,0.4) P13(-1.2,0.4) P14(-0.4,0.4) P15(0.4,0.4) P16(1.2,0.4) P17(2,0.4) P18(2.8,0.4) P19(3.6,0.4) P20(4.4,0.4) P21(5.2,0.4) P22(6,0.4) P23(6.8,0.4) P24(7.6,0.4) P25(8.4,0.4) P26(9.2,0.4) P27(10,0.4) P28(10.8,0.4) R1(-10.8,-0.4) R2(-10,-0.4) R3(-9.2,-0.4) R4(-8.4,-0.4) R5(-7.6,-0.4) R6(-6.8,-0.4) R7(-6,-0.4) R8(-5.2,-0.4) R9(-4.4,-0.4) R10(-3.6,-0.4) R11(-2.8,-0.4) R12(-2,-0.4) R13(-1.2,-0.4) R14(-0.4,-0.4) R15(0.4,-0.4) R16(1.2,-0.4) R17(2,-0.4) R18(2.8,-0.4) R19(3.6,-0.4) R20(4.4,-0.4) R21(5.2,-0.4) R22(6,-0.4) R23(6.8,-0.4) R24(7.6,-0.4) R25(8.4,-0.4) R26(9.2,-0.4) R27(10,-0.4) R28(10.8,-0.4) T1(-10.8,-1.2) T2(-10,-1.2) T4(-8.4,-1.2) T5(-7.6,-1.2) T6(-6.8,-1.2) T7(-6,-1.2) T8(-5.2,-1.2) T9(-4.4,-1.2) T10(-3.6,-1.2) T11(-2.8,-1.2) T12(-2,-1.2) T13(-1.2,-1.2) T14(-0.4,-1.2) T15(0.4,-1.2) T16(1.2,-1.2) T17(2,-1.2) T18(2.8,-1.2) T19(3.6,-1.2) T20(4.4,-1.2) T21(5.2,-1.2) T22(6,-1.2) T23(6.8,-1.2) T24(7.6,-1.2) T25(8.4,-1.2) T27(10,-1.2) T28(10.8,-1.2) U1(-10.8,-2) U2(-10,-2) U3(-9.2,-2) U4(-8.4,-2) U5(-7.6,-2) U6(-6.8,-2) U7(-6,-2) U8(-5.2,-2) U9(-4.4,-2) U10(-3.6,-2) U11(-2.8,-2) U12(-2,-2) U13(-1.2,-2) U14(-0.4,-2) U15(0.4,-2) U16(1.2,-2) U17(2,-2) U18(2.8,-2) U19(3.6,-2) U20(4.4,-2) U21(5.2,-2) U22(6,-2) U23(6.8,-2) U24(7.6,-2) U25(8.4,-2) U26(9.2,-2) U27(10,-2) U28(10.8,-2) V1(-10.8,-2.8) V2(-10,-2.8) V3(-9.2,-2.8) V4(-8.4,-2.8) V5(-7.6,-2.8) V6(-6.8,-2.8) V7(-6,-2.8) V8(-5.2,-2.8) V9(-4.4,-2.8) V10(-3.6,-2.8) V11(-2.8,-2.8) V12(-2,-2.8) V13(-1.2,-2.8) V14(-0.4,-2.8) V15(0.4,-2.8) V16(1.2,-2.8) V17(2,-2.8) V18(2.8,-2.8) V19(3.6,-2.8) V20(4.4,-2.8) V21(5.2,-2.8) V22(6,-2.8) V23(6.8,-2.8) V24(7.6,-2.8) V25(8.4,-2.8) V26(9.2,-2.8) V27(10,-2.8) V28(10.8,-2.8) W1(-10.8,-3.6) W2(-10,-3.6) W4(-8.4,-3.6) W5(-7.6,-3.6) W6(-6.8,-3.6) W7(-6,-3.6) W8(-5.2,-3.6) W9(-4.4,-3.6) W10(-3.6,-3.6) W11(-2.8,-3.6) W12(-2,-3.6) W13(-1.2,-3.6) W14(-0.4,-3.6) W15(0.4,-3.6) W16(1.2,-3.6) W17(2,-3.6) W18(2.8,-3.6) W19(3.6,-3.6) W20(4.4,-3.6) W21(5.2,-3.6) W22(6,-3.6) W23(6.8,-3.6) W24(7.6,-3.6) W25(8.4,-3.6) W27(10,-3.6) W28(10.8,-3.6) Y1(-10.8,-4.4) Y2(-10,-4.4) Y3(-9.2,-4.4) Y4(-8.4,-4.4) Y5(-7.6,-4.4) Y6(-6.8,-4.4) Y7(-6,-4.4) Y8(-5.2,-4.4) Y9(-4.4,-4.4) Y10(-3.6,-4.4) Y11(-2.8,-4.4) Y12(-2,-4.4) Y13(-1.2,-4.4) Y14(-0.4,-4.4) Y15(0.4,-4.4) Y16(1.2,-4.4) Y17(2,-4.4) Y18(2.8,-4.4) Y19(3.6,-4.4) Y20(4.4,-4.4) Y21(5.2,-4.4) Y22(6,-4.4) Y23(6.8,-4.4) Y24(7.6,-4.4) Y25(8.4,-4.4) Y26(9.2,-4.4) Y27(10,-4.4) Y28(10.8,-4.4)